# Altium footprint library PowerProducts.PCBLIB: 166 footprints (part 4 of 11)
Each footprint in its own frame and in the unit in brackets; x right, y up, seen from the top. Pads: shape width x height; smd on the part's side, far side on the other; paste and mask are expansions set on the pad; w line width, h text height; cw(c..) or ccw(c..) is an arc to the next point about the centre after c.
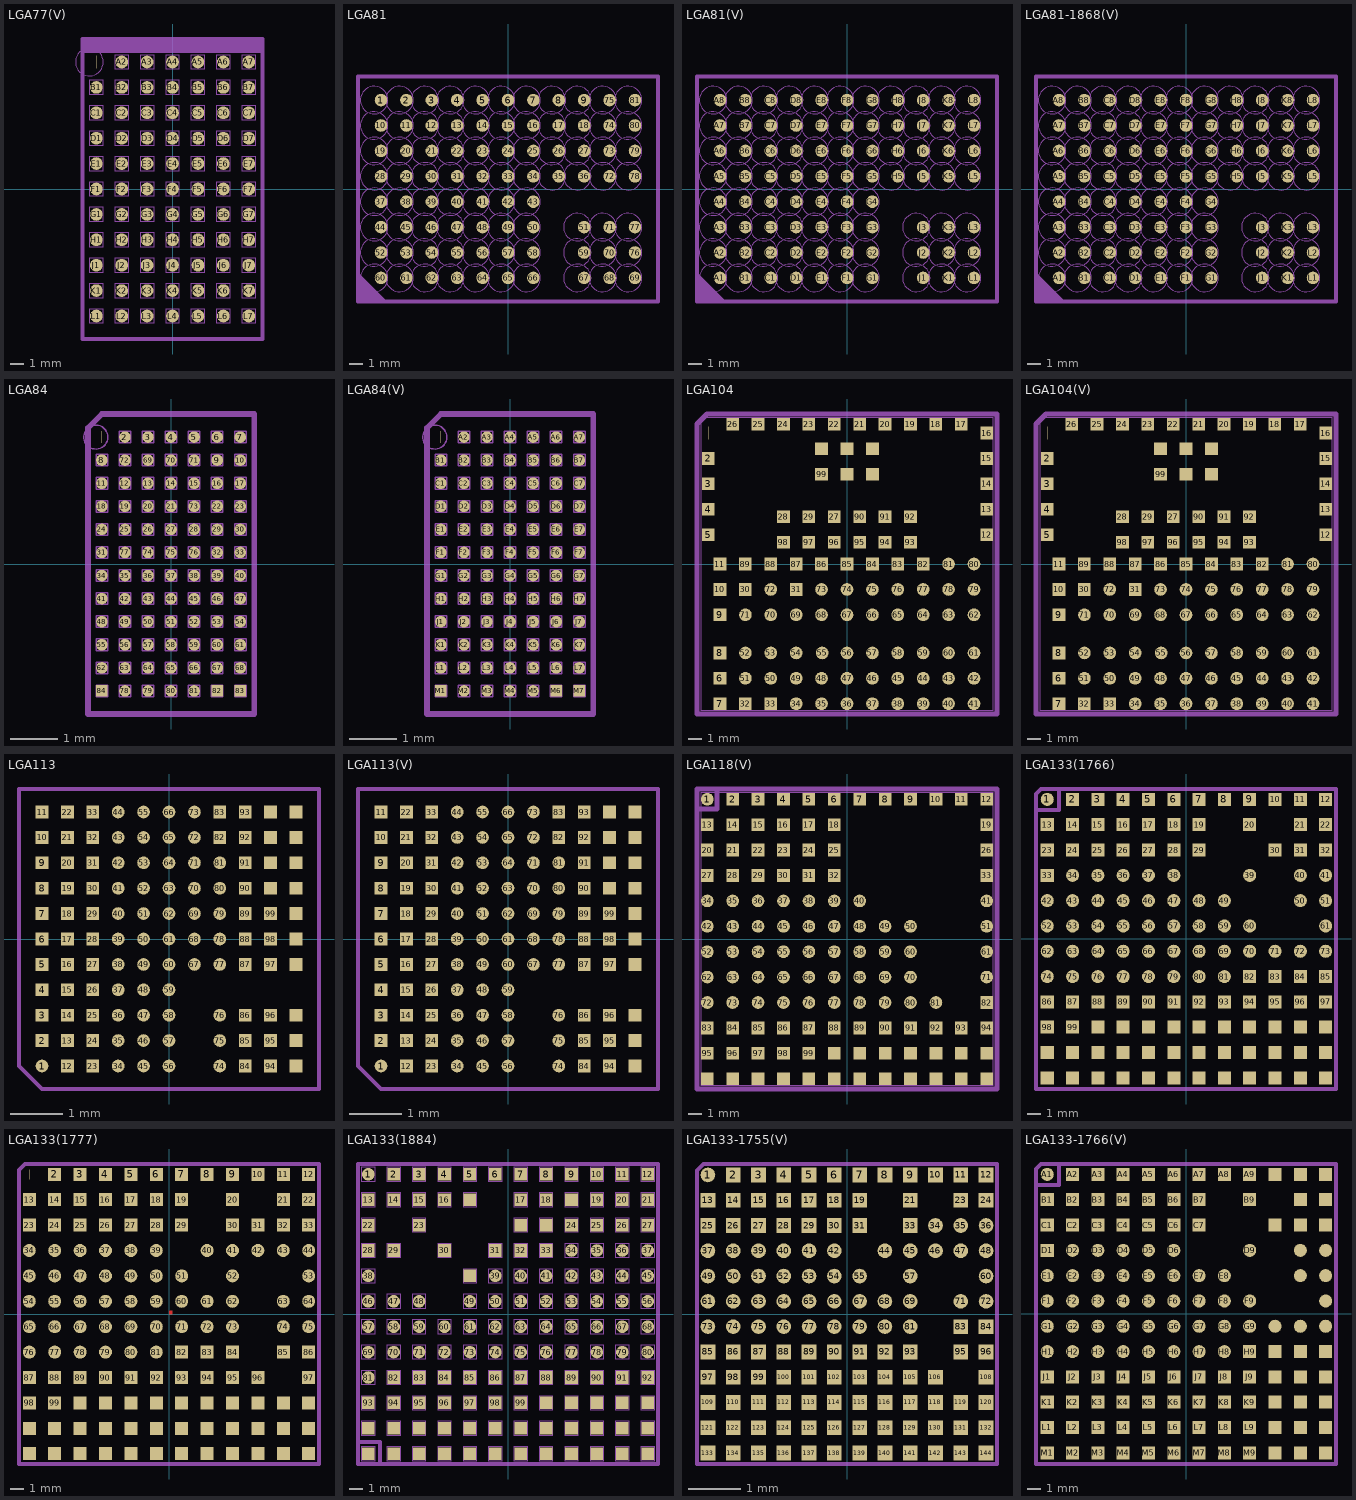
[diagram p3: the footprints below, top view; thin cyan lines are the x and y axes]

## LGA77(V) [mil]
pads (77):
  rrect100% 0x37.5 smd: A1(-225,375)
  rrect100% 37.5x37.5 smd: A2(-150,375) A3(-75,375) A4(0,375) A5(75,375) A6(150,375) A7(225,375) B1(-225,300) B2(-150,300) B3(-75,300) B4(0,300) B5(75,300) B6(150,300) B7(225,300) C1(-225,225) C2(-150,225) C3(-75,225) C4(0,225) C5(75,225) C6(150,225) C7(225,225) D1(-225,150) D2(-150,150) D3(-75,150) D4(0,150) D5(75,150) D6(150,150) D7(225,150) E1(-225,75) E2(-150,75) E3(-75,75) E4(0,75) E5(75,75) E6(150,75) E7(225,75) F1(-225,0) F2(-150,0) F3(-75,0) F4(0,0) F5(75,0) F6(150,0) F7(225,0) G1(-225,-75) G2(-150,-75) G3(-75,-75) G4(0,-75) G5(75,-75) G6(150,-75) G7(225,-75) H1(-225,-150) H2(-150,-150) H3(-75,-150) H4(0,-150) H5(75,-150) H6(150,-150) H7(225,-150) J1(-225,-225) J2(-150,-225) J3(-75,-225) J4(0,-225) J5(75,-225) J6(150,-225) J7(225,-225) K1(-225,-300) K2(-150,-300) K3(-75,-300) K4(0,-300) K5(75,-300) K6(150,-300) K7(225,-300) L1(-225,-375) L2(-150,-375) L3(-75,-375) L4(0,-375) L5(75,-375) L6(150,-375) L7(225,-375)
Mechanical 2:
  drawing of 314 lines, arcs and shapes, not listed

## LGA81 [mil]
pads (81):
  rrect100% 37.2x37.2 smd: 1(-375,262.5) 2(-300,262.5) 3(-225,262.5) 4(-150,262.5) 5(-75,262.5) 6(0,262.5) 7(75,262.5) 8(150,262.5) 9(225,262.5) 10(-375,187.5) 11(-300,187.5) 12(-225,187.5) 13(-150,187.5) 14(-75,187.5) 15(0,187.5) 16(75,187.5) 17(150,187.5) 18(225,187.5) 19(-375,112.5) 20(-300,112.5) 21(-225,112.5) 22(-150,112.5) 23(-75,112.5) 24(0,112.5) 25(75,112.5) 26(150,112.5) 27(225,112.5) 28(-375,37.5) 29(-300,37.5) 30(-225,37.5) 31(-150,37.5) 32(-75,37.5) 33(0,37.5) 34(75,37.5) 35(150,37.5) 36(225,37.5) 37(-375,-37.5) 38(-300,-37.5) 39(-225,-37.5) 40(-150,-37.5) 41(-75,-37.5) 42(0,-37.5) 43(75,-37.5) 44(-375,-112.5) 45(-300,-112.5) 46(-225,-112.5) 47(-150,-112.5) 48(-75,-112.5) 49(0,-112.5) 50(75,-112.5) 51(225,-112.5) 52(-375,-187.5) 53(-300,-187.5) 54(-225,-187.5) 55(-150,-187.5) 56(-75,-187.5) 57(0,-187.5) 58(75,-187.5) 59(225,-187.5) 60(-375,-262.5) 61(-300,-262.5) 62(-225,-262.5) 63(-150,-262.5) 64(-75,-262.5) 65(0,-262.5) 66(75,-262.5) 67(225,-262.5) 68(300,-262.5) 69(375,-262.5) 70(300,-187.5) 71(300,-112.5) 72(300,37.5) 73(300,112.5) 74(300,187.5) 75(300,262.5) 76(375,-187.5) 77(375,-112.5) 78(375,37.5) 79(375,112.5) 80(375,187.5) 81(375,262.5)
Mechanical 2:
  drawing of 172 lines, arcs and shapes, not listed

## LGA81(V) [mil]
pads (81):
  rrect100% 37.2x37.2 smd: A1(-375,-262.5) A2(-375,-187.5) A3(-375,-112.5) A4(-375,-37.5) A5(-375,37.5) A6(-375,112.5) A7(-375,187.5) A8(-375,262.5) B1(-300,-262.5) B2(-300,-187.5) B3(-300,-112.5) B4(-300,-37.5) B5(-300,37.5) B6(-300,112.5) B7(-300,187.5) B8(-300,262.5) C1(-225,-262.5) C2(-225,-187.5) C3(-225,-112.5) C4(-225,-37.5) C5(-225,37.5) C6(-225,112.5) C7(-225,187.5) C8(-225,262.5) D1(-150,-262.5) D2(-150,-187.5) D3(-150,-112.5) D4(-150,-37.5) D5(-150,37.5) D6(-150,112.5) D7(-150,187.5) D8(-150,262.5) E1(-75,-262.5) E2(-75,-187.5) E3(-75,-112.5) E4(-75,-37.5) E5(-75,37.5) E6(-75,112.5) E7(-75,187.5) E8(-75,262.5) F1(0,-262.5) F2(0,-187.5) F3(0,-112.5) F4(0,-37.5) F5(0,37.5) F6(0,112.5) F7(0,187.5) F8(0,262.5) G1(75,-262.5) G2(75,-187.5) G3(75,-112.5) G4(75,-37.5) G5(75,37.5) G6(75,112.5) G7(75,187.5) G8(75,262.5) H5(150,37.5) H6(150,112.5) H7(150,187.5) H8(150,262.5) J1(225,-262.5) J2(225,-187.5) J3(225,-112.5) J5(225,37.5) J6(225,112.5) J7(225,187.5) J8(225,262.5) K1(300,-262.5) K2(300,-187.5) K3(300,-112.5) K5(300,37.5) K6(300,112.5) K7(300,187.5) K8(300,262.5) L1(375,-262.5) L2(375,-187.5) L3(375,-112.5) L5(375,37.5) L6(375,112.5) L7(375,187.5) L8(375,262.5)
Mechanical 2:
  drawing of 172 lines, arcs and shapes, not listed

## LGA81-1868(V) [mil]
pads (81):
  rrect100% 37.2x37.2 smd: A1(-375,-262.5) A2(-375,-187.5) A3(-375,-112.5) A4(-375,-37.5) A5(-375,37.5) A6(-375,112.5) A7(-375,187.5) A8(-375,262.5) B1(-300,-262.5) B2(-300,-187.5) B3(-300,-112.5) B4(-300,-37.5) B5(-300,37.5) B6(-300,112.5) B7(-300,187.5) B8(-300,262.5) C1(-225,-262.5) C2(-225,-187.5) C3(-225,-112.5) C4(-225,-37.5) C5(-225,37.5) C6(-225,112.5) C7(-225,187.5) C8(-225,262.5) D1(-150,-262.5) D2(-150,-187.5) D3(-150,-112.5) D4(-150,-37.5) D5(-150,37.5) D6(-150,112.5) D7(-150,187.5) D8(-150,262.5) E1(-75,-262.5) E2(-75,-187.5) E3(-75,-112.5) E4(-75,-37.5) E5(-75,37.5) E6(-75,112.5) E7(-75,187.5) E8(-75,262.5) F1(0,-262.5) F2(0,-187.5) F3(0,-112.5) F4(0,-37.5) F5(0,37.5) F6(0,112.5) F7(0,187.5) F8(0,262.5) G1(75,-262.5) G2(75,-187.5) G3(75,-112.5) G4(75,-37.5) G5(75,37.5) G6(75,112.5) G7(75,187.5) G8(75,262.5) H5(150,37.5) H6(150,112.5) H7(150,187.5) H8(150,262.5) J1(225,-262.5) J2(225,-187.5) J3(225,-112.5) J5(225,37.5) J6(225,112.5) J7(225,187.5) J8(225,262.5) K1(300,-262.5) K2(300,-187.5) K3(300,-112.5) K5(300,37.5) K6(300,112.5) K7(300,187.5) K8(300,262.5) L1(375,-262.5) L2(375,-187.5) L3(375,-112.5) L5(375,37.5) L6(375,112.5) L7(375,187.5) L8(375,262.5)
Mechanical 2:
  drawing of 172 lines, arcs and shapes, not listed

## LGA84 [mil]
pads (84):
  rrect100% 0x9.91 smd: 1(-57.15,104.78)
  rrect100% 9.53x9.53 smd: 2(-38.1,104.78) 3(-19.05,104.78) 4(0,104.78) 5(19.05,104.78) 6(38.1,104.78) 7(57.15,104.78) 8(-57.15,85.73) 9(38.1,85.73) 10(57.15,85.73) 11(-57.15,66.68) 12(-38.1,66.68) 13(-19.05,66.68) 14(0,66.68) 15(19.05,66.68) 16(38.1,66.68) 17(57.15,66.68) 18(-57.15,47.63) 19(-38.1,47.63) 20(-19.05,47.63) 21(0,47.63) 22(38.1,47.63) 23(57.15,47.63) 24(-57.15,28.58) 25(-38.1,28.58) 26(-19.05,28.58) 27(0,28.58) 28(19.05,28.58) 29(38.1,28.58) 30(57.15,28.58) 31(-57.15,9.53) 32(38.1,9.53) 33(57.15,9.53) 34(-57.15,-9.53) 35(-38.1,-9.53) 36(-19.05,-9.53) 37(0,-9.53) 38(19.05,-9.53) 39(38.1,-9.53) 40(57.15,-9.53) 41(-57.15,-28.58) 42(-38.1,-28.58) 43(-19.05,-28.58) 44(0,-28.58) 45(19.05,-28.58) 46(38.1,-28.58) 47(57.15,-28.58) 48(-57.15,-47.63) 49(-38.1,-47.63) 50(-19.05,-47.63) 51(0,-47.63) 52(19.05,-47.63) 53(38.1,-47.63) 54(57.15,-47.63) 55(-57.15,-66.68) 56(-38.1,-66.68) 57(-19.05,-66.68) 58(0,-66.68) 59(19.05,-66.68) 60(38.1,-66.68) 61(57.15,-66.68) 62(-57.15,-85.73) 63(-38.1,-85.73) 64(-19.05,-85.73) 65(0,-85.73) 66(19.05,-85.73) 67(38.1,-85.73) 68(57.15,-85.73) 69(-19.05,85.73) 70(0,85.73) 71(19.05,85.73) 72(-38.1,85.73) 73(19.05,47.63) 74(-19.05,9.53) 75(0,9.53) 76(19.05,9.53) 77(-38.1,9.53) 78(-38.1,-104.78) 79(-19.05,-104.78) 80(0,-104.78) 81(19.05,-104.78)
  rect 9.53x9.53 smd: 82(38.1,-104.78) 83(57.15,-104.78) 84(-57.15,-104.78)
Mechanical 2:
  drawing of 671 lines, arcs and shapes, not listed

## LGA84(V) [mil]
pads (84):
  rrect100% 0x9.91 smd: A1(-57.15,104.78)
  rrect100% 9.53x9.53 smd: A2(-38.1,104.78) A3(-19.05,104.78) A4(0,104.78) A5(19.05,104.78) A6(38.1,104.78) A7(57.15,104.78) B1(-57.15,85.73) B2(-38.1,85.73) B3(-19.05,85.73) B4(0,85.73) B5(19.05,85.73) B6(38.1,85.73) B7(57.15,85.73) C1(-57.15,66.68) C2(-38.1,66.68) C3(-19.05,66.68) C4(0,66.68) C5(19.05,66.68) C6(38.1,66.68) C7(57.15,66.68) D1(-57.15,47.63) D2(-38.1,47.63) D3(-19.05,47.63) D4(0,47.63) D5(19.05,47.63) D6(38.1,47.63) D7(57.15,47.63) E1(-57.15,28.58) E2(-38.1,28.58) E3(-19.05,28.58) E4(0,28.58) E5(19.05,28.58) E6(38.1,28.58) E7(57.15,28.58) F1(-57.15,9.53) F2(-38.1,9.53) F3(-19.05,9.53) F4(0,9.53) F5(19.05,9.53) F6(38.1,9.53) F7(57.15,9.53) G1(-57.15,-9.53) G2(-38.1,-9.53) G3(-19.05,-9.53) G4(0,-9.53) G5(19.05,-9.53) G6(38.1,-9.53) G7(57.15,-9.53) H1(-57.15,-28.58) H2(-38.1,-28.58) H3(-19.05,-28.58) H4(0,-28.58) H5(19.05,-28.58) H6(38.1,-28.58) H7(57.15,-28.58) J1(-57.15,-47.63) J2(-38.1,-47.63) J3(-19.05,-47.63) J4(0,-47.63) J5(19.05,-47.63) J6(38.1,-47.63) J7(57.15,-47.63) K1(-57.15,-66.68) K2(-38.1,-66.68) K3(-19.05,-66.68) K4(0,-66.68) K5(19.05,-66.68) K6(38.1,-66.68) K7(57.15,-66.68) L1(-57.15,-85.73) L2(-38.1,-85.73) L3(-19.05,-85.73) L4(0,-85.73) L5(19.05,-85.73) L6(38.1,-85.73) L7(57.15,-85.73) M2(-38.1,-104.78) M3(-19.05,-104.78) M4(0,-104.78) M5(19.05,-104.78)
  rect 9.53x9.53 smd: M1(-57.15,-104.78) M6(38.1,-104.78) M7(57.15,-104.78)
Mechanical 2:
  drawing of 339 lines, arcs and shapes, not listed

## LGA104 [mil]
pads (104):
  rrect100% 0x37.5 smd: 1(-409.97,386.66)
  rect 37.5x37.5 smd: 2(-409.97,311.66) 3(-409.97,236.66) 4(-409.97,161.66) 5(-409.97,86.66) 6(-375,-337.5) 7(-375,-412.5) 8(-375,-262.5) 9(-375,-150) 10(-375,-75) 11(-375,0) 12(412.59,86.66) 13(412.59,161.66) 14(412.59,236.66) 15(412.59,311.66) 16(412.59,386.66) 17(337.45,412.72) 18(262.45,412.72) 19(187.45,412.72) 20(112.45,412.72) 21(37.45,412.72) 22(-37.55,412.72) 23(-112.55,412.72) 24(-187.55,412.72) 25(-262.55,412.72) 26(-337.55,412.72) 27(-37.55,139.37) 28(-187.55,139.37) 29(-112.55,139.37) 30(-300,-75) 31(-150,-75) 32(-300,-412.5) 33(-225,-412.5) 82(225,0) 83(150,0) 84(75,0) 85(0,0) 86(-75,0) 87(-150,0) 88(-225,0) 89(-300,0) 90(37.45,139.37) 91(112.45,139.37) 92(187.45,139.37) 93(187.45,64.37) 94(112.45,64.37) 95(37.45,64.37) 96(-37.55,64.37) 97(-112.55,64.37) 98(-187.55,64.37) 99(-75,265.45) 100(0,265.45) 101(75,265.45) 102(75,340.45) 103(0,340.45) 104(-75,340.45)
  rrect100% 37.5x37.5 smd: 34(-150,-412.5) 35(-75,-412.5) 36(0,-412.5) 37(75,-412.5) 38(150,-412.5) 39(225,-412.5) 40(300,-412.5) 41(375,-412.5) 42(375,-337.5) 43(300,-337.5) 44(225,-337.5) 45(150,-337.5) 46(75,-337.5) 47(0,-337.5) 48(-75,-337.5) 49(-150,-337.5) 50(-225,-337.5) 51(-300,-337.5) 52(-300,-262.5) 53(-225,-262.5) 54(-150,-262.5) 55(-73.23,-262.5) 56(0,-262.5) 57(75,-262.5) 58(150,-262.5) 59(225,-262.5) 60(300,-262.5) 61(375,-262.5) 62(375,-150) 63(300,-150) 64(225,-150) 65(150,-150) 66(75,-150) 67(0,-150) 68(-75,-150) 69(-150,-150) 70(-225,-150) 71(-300,-150) 72(-225,-75) 73(-75,-75) 74(0,-75) 75(75,-75) 76(150,-75) 77(225,-75) 78(300,-75) 79(375,-75) 80(375,0) 81(300,0)
Top Layer:
  region: 0,0 10,0 10,10 0,10
Top Paste:
  region: 0,0 10,0 10,10 0,10
Top Solder:
  region: 0,0 10,0 10,10 0,10
Mechanical 2:
  lines w0.3: -431.69,-431.69 431.69,-431.69 431.69,431.69 -431.69,431.69 -431.69,-431.69
  lines w15: -442.91,-442.91 -442.91,413.39 -413.39,442.91 442.91,442.91 442.91,-442.91 -442.91,-442.91

## LGA104(V) [mil]
pads (104):
  rrect100% 0x37.5 smd: 1(-409.97,386.66)
  rect 37.5x37.5 smd: 2(-409.97,311.66) 3(-409.97,236.66) 4(-409.97,161.66) 5(-409.97,86.66) 6(-375,-337.5) 7(-375,-412.5) 8(-375,-262.5) 9(-375,-150) 10(-375,-75) 11(-375,0) 12(412.59,86.66) 13(412.59,161.66) 14(412.59,236.66) 15(412.59,311.66) 16(412.59,386.66) 17(337.45,412.72) 18(262.45,412.72) 19(187.45,412.72) 20(112.45,412.72) 21(37.45,412.72) 22(-37.55,412.72) 23(-112.55,412.72) 24(-187.55,412.72) 25(-262.55,412.72) 26(-337.55,412.72) 27(-37.55,139.37) 28(-187.55,139.37) 29(-112.55,139.37) 30(-300,-75) 31(-150,-75) 32(-300,-412.5) 33(-225,-412.5) 82(225,0) 83(150,0) 84(75,0) 85(0,0) 86(-75,0) 87(-150,0) 88(-225,0) 89(-300,0) 90(37.45,139.37) 91(112.45,139.37) 92(187.45,139.37) 93(187.45,64.37) 94(112.45,64.37) 95(37.45,64.37) 96(-37.55,64.37) 97(-112.55,64.37) 98(-187.55,64.37) 99(-75,265.45) 100(0,265.45) 101(75,265.45) 102(75,340.45) 103(0,340.45) 104(-75,340.45)
  rrect100% 37.5x37.5 smd: 34(-150,-412.5) 35(-75,-412.5) 36(0,-412.5) 37(75,-412.5) 38(150,-412.5) 39(225,-412.5) 40(300,-412.5) 41(375,-412.5) 42(375,-337.5) 43(300,-337.5) 44(225,-337.5) 45(150,-337.5) 46(75,-337.5) 47(0,-337.5) 48(-75,-337.5) 49(-150,-337.5) 50(-225,-337.5) 51(-300,-337.5) 52(-300,-262.5) 53(-225,-262.5) 54(-150,-262.5) 55(-73.23,-262.5) 56(0,-262.5) 57(75,-262.5) 58(150,-262.5) 59(225,-262.5) 60(300,-262.5) 61(375,-262.5) 62(375,-150) 63(300,-150) 64(225,-150) 65(150,-150) 66(75,-150) 67(0,-150) 68(-75,-150) 69(-150,-150) 70(-225,-150) 71(-300,-150) 72(-225,-75) 73(-75,-75) 74(0,-75) 75(75,-75) 76(150,-75) 77(225,-75) 78(300,-75) 79(375,-75) 80(375,0) 81(300,0)
Top Layer:
  region: 0,0 10,0 10,10 0,10
Top Paste:
  region: 0,0 10,0 10,10 0,10
Top Solder:
  region: 0,0 10,0 10,10 0,10
Mechanical 2:
  lines w0.3: -431.69,-431.69 431.69,-431.69 431.69,431.69 -431.69,431.69 -431.69,-431.69
  lines w15: -442.91,-442.91 -442.91,413.39 -413.39,442.91 442.91,442.91 442.91,-442.91 -442.91,-442.91

## LGA113 [mil]
pads (113):
  rrect100% 9.53x9.53 smd: 1(-95.25,-95.25) 34(-38.1,-95.25) 35(-38.1,-76.2) 36(-38.1,-57.15) 37(-38.1,-38.1) 38(-38.1,-19.05) 39(-38.1,0) 40(-38.1,19.05) 41(-38.1,38.1) 42(-38.1,57.15) 43(-38.1,76.2) 44(-38.1,95.25) 45(-19.05,-95.25) 46(-19.05,-76.2) 47(-19.05,-57.15) 48(-19.05,-38.1) 49(-19.05,-19.05) 50(-19.05,0) 51(-19.05,19.05) 52(-19.05,38.1) 53(-19.05,57.15) 54(-19.05,76.2) 55(-19.05,95.25) 56(0,-95.25) 57(0,-76.2) 58(0,-57.15) 59(0,-38.1) 60(0,-19.05) 61(0,0) 62(0,19.05) 63(0,38.1) 64(0,57.15) 65(0,76.2) 66(0,95.25) 67(19.05,-19.05) 68(19.05,0) 69(19.05,19.05) 70(19.05,38.1) 71(19.05,57.15) 72(19.05,76.2) 73(19.05,95.25) 74(38.1,-95.25) 75(38.1,-76.2) 76(38.1,-57.15) 77(38.1,-19.05) 78(38.1,0) 79(38.1,19.05) 80(38.1,38.1) 81(38.1,57.15)
  rect 9.53x9.53 smd: 2(-95.25,-76.2) 3(-95.25,-57.15) 4(-95.25,-38.1) 5(-95.25,-19.05) 6(-95.25,0) 7(-95.25,19.05) 8(-95.25,38.1) 9(-95.25,57.15) 10(-95.25,76.2) 11(-95.25,95.25) 12(-76.2,-95.25) 13(-76.2,-76.2) 14(-76.2,-57.15) 15(-76.2,-38.1) 16(-76.2,-19.05) 17(-76.2,0) 18(-76.2,19.05) 19(-76.2,38.1) 20(-76.2,57.15) 21(-76.2,76.2) 22(-76.2,95.25) 23(-57.15,-95.25) 24(-57.15,-76.2) 25(-57.15,-57.15) 26(-57.15,-38.1) 27(-57.15,-19.05) 28(-57.15,0) 29(-57.15,19.05) 30(-57.15,38.1) 31(-57.15,57.15) 32(-57.15,76.2) 33(-57.15,95.25) 82(38.1,76.2) 83(38.1,95.25) 84(57.15,-95.25) 85(57.15,-76.2) 86(57.15,-57.15) 87(57.15,-19.05) 88(57.15,0) 89(57.15,19.05) 90(57.15,38.1) 91(57.15,57.15) 92(57.15,76.2) 93(57.15,95.25) 94(76.2,-95.25) 95(76.2,-76.2) 96(76.2,-57.15) 97(76.2,-19.05) 98(76.2,0) 99(76.2,19.05) 100(76.2,38.1) 101(76.2,57.15) 102(76.2,76.2) 103(76.2,95.25) 104(95.25,-95.25) 105(95.25,-76.2) 106(95.25,-57.15) 107(95.25,-19.05) 108(95.25,0) 109(95.25,19.05) 110(95.25,38.1) 111(95.25,57.15) 112(95.25,76.2) 113(95.25,95.25)
Mechanical 2:
  lines w3.05: -112.5,-95.35 -95.35,-112.5 112.5,-112.5 112.5,112.5 -112.5,112.5 -112.5,-95.35

## LGA113(V) [mil]
pads (113):
  rrect100% 9.53x9.53 smd: 1(-95.25,-95.25) 34(-38.1,-95.25) 35(-38.1,-76.2) 36(-38.1,-57.15) 37(-38.1,-38.1) 38(-38.1,-19.05) 39(-38.1,0) 40(-38.1,19.05) 41(-38.1,38.1) 42(-38.1,57.15) 43(-38.1,76.2) 44(-38.1,95.25) 45(-19.05,-95.25) 46(-19.05,-76.2) 47(-19.05,-57.15) 48(-19.05,-38.1) 49(-19.05,-19.05) 50(-19.05,0) 51(-19.05,19.05) 52(-19.05,38.1) 53(-19.05,57.15) 54(-19.05,76.2) 55(-19.05,95.25) 56(0,-95.25) 57(0,-76.2) 58(0,-57.15) 59(0,-38.1) 60(0,-19.05) 61(0,0) 62(0,19.05) 63(0,38.1) 64(0,57.15) 65(0,76.2) 66(0,95.25) 67(19.05,-19.05) 68(19.05,0) 69(19.05,19.05) 70(19.05,38.1) 71(19.05,57.15) 72(19.05,76.2) 73(19.05,95.25) 74(38.1,-95.25) 75(38.1,-76.2) 76(38.1,-57.15) 77(38.1,-19.05) 78(38.1,0) 79(38.1,19.05) 80(38.1,38.1) 81(38.1,57.15)
  rect 9.53x9.53 smd: 2(-95.25,-76.2) 3(-95.25,-57.15) 4(-95.25,-38.1) 5(-95.25,-19.05) 6(-95.25,0) 7(-95.25,19.05) 8(-95.25,38.1) 9(-95.25,57.15) 10(-95.25,76.2) 11(-95.25,95.25) 12(-76.2,-95.25) 13(-76.2,-76.2) 14(-76.2,-57.15) 15(-76.2,-38.1) 16(-76.2,-19.05) 17(-76.2,0) 18(-76.2,19.05) 19(-76.2,38.1) 20(-76.2,57.15) 21(-76.2,76.2) 22(-76.2,95.25) 23(-57.15,-95.25) 24(-57.15,-76.2) 25(-57.15,-57.15) 26(-57.15,-38.1) 27(-57.15,-19.05) 28(-57.15,0) 29(-57.15,19.05) 30(-57.15,38.1) 31(-57.15,57.15) 32(-57.15,76.2) 33(-57.15,95.25) 82(38.1,76.2) 83(38.1,95.25) 84(57.15,-95.25) 85(57.15,-76.2) 86(57.15,-57.15) 87(57.15,-19.05) 88(57.15,0) 89(57.15,19.05) 90(57.15,38.1) 91(57.15,57.15) 92(57.15,76.2) 93(57.15,95.25) 94(76.2,-95.25) 95(76.2,-76.2) 96(76.2,-57.15) 97(76.2,-19.05) 98(76.2,0) 99(76.2,19.05) 100(76.2,38.1) 101(76.2,57.15) 102(76.2,76.2) 103(76.2,95.25) 104(95.25,-95.25) 105(95.25,-76.2) 106(95.25,-57.15) 107(95.25,-19.05) 108(95.25,0) 109(95.25,19.05) 110(95.25,38.1) 111(95.25,57.15) 112(95.25,76.2) 113(95.25,95.25)
Mechanical 2:
  lines w3.05: -112.5,-95.35 -95.35,-112.5 112.5,-112.5 112.5,112.5 -112.5,112.5 -112.5,-95.35

## LGA118(V) [mil]
pads (118):
  rrect100% 37.5x37.5 smd: 1(-412.5,412.5) 34(-412.5,112.5) 35(-337.5,112.5) 36(-262.5,112.5) 37(-187.5,112.5) 38(-112.5,112.5) 39(-37.5,112.5) 40(37.5,112.5) 41(412.5,112.5) 42(-412.5,37.5) 43(-337.5,37.5) 44(-262.5,37.5) 45(-187.5,37.5) 46(-112.5,37.5) 47(-37.5,37.5) 48(37.5,37.5) 49(112.5,37.5) 50(187.5,37.5) 51(412.5,37.5) 52(-412.5,-37.5) 53(-337.5,-37.5) 54(-262.5,-37.5) 55(-187.5,-37.5) 56(-112.5,-37.5) 57(-37.5,-37.5) 58(37.5,-37.5) 59(112.5,-37.5) 60(187.5,-37.5) 61(412.5,-37.5) 62(-412.5,-112.5) 63(-337.5,-112.5) 64(-262.5,-112.5) 65(-187.5,-112.5) 66(-112.5,-112.5) 67(-37.5,-112.5) 68(37.5,-112.5) 69(112.5,-112.5) 70(187.5,-112.5) 71(412.5,-112.5) 72(-412.5,-187.5) 73(-337.5,-187.5) 74(-262.5,-187.5) 75(-187.5,-187.5) 76(-112.5,-187.5) 77(-37.5,-187.5) 78(37.5,-187.5) 79(112.5,-187.5) 80(187.5,-187.5) 81(262.5,-187.5)
  rect 37.5x37.5 smd: 2(-337.5,412.5) 3(-262.5,412.5) 4(-187.5,412.5) 5(-112.5,412.5) 6(-37.5,412.5) 7(37.5,412.5) 8(112.5,412.5) 9(187.5,412.5) 10(262.5,412.5) 11(337.5,412.5) 12(412.5,412.5) 13(-412.5,337.5) 14(-337.5,337.5) 15(-262.5,337.5) 16(-187.5,337.5) 17(-112.5,337.5) 18(-37.5,337.5) 19(412.5,337.5) 20(-412.5,262.5) 21(-337.5,262.5) 22(-262.5,262.5) 23(-187.5,262.5) 24(-112.5,262.5) 25(-37.5,262.5) 26(412.5,262.5) 27(-412.5,187.5) 28(-337.5,187.5) 29(-262.5,187.5) 30(-187.5,187.5) 31(-112.5,187.5) 32(-37.5,187.5) 33(412.5,187.5) 82(412.5,-187.5) 83(-412.5,-262.5) 84(-337.5,-262.5) 85(-262.5,-262.5) 86(-187.5,-262.5) 87(-112.5,-262.5) 88(-37.5,-262.5) 89(37.5,-262.5) 90(112.5,-262.5) 91(187.5,-262.5) 92(262.5,-262.5) 93(337.5,-262.5) 94(412.5,-262.5) 95(-412.5,-337.5) 96(-337.5,-337.5) 97(-262.5,-337.5) 98(-187.5,-337.5) 99(-112.5,-337.5) 100(-37.5,-337.5) 101(37.5,-337.5) 102(112.5,-337.5) 103(187.5,-337.5) 104(262.5,-337.5) 105(337.5,-337.5) 106(412.5,-337.5) 107(-412.5,-412.5) 108(-337.5,-412.5) 109(-262.5,-412.5) 110(-187.5,-412.5) 111(-112.5,-412.5) 112(-37.5,-412.5) 113(37.5,-412.5) 114(112.5,-412.5) 115(187.5,-412.5) 116(262.5,-412.5) 117(337.5,-412.5) 118(412.5,-412.5)
Mechanical 2:
  lines w0.3: -431.69,-431.69 431.69,-431.69 431.69,431.69 -431.69,431.69 -431.69,-431.69
  lines w15: -442.5,383.86 -383.86,383.86 -383.86,442.5 ; -442.91,-442.91 -442.91,442.09 -442.09,442.91 442.91,442.91 442.91,-442.91 -442.91,-442.91

## LGA133(1766) [mil]
pads (133):
  rrect100% 38.68x38.68 smd: 1(-412.5,412.5) 34(-337.5,187.5) 35(-262.5,187.5) 36(-187.5,187.5) 37(-112.5,187.5) 38(-37.5,187.5) 39(187.5,187.5) 40(337.5,187.5) 41(412.5,187.5) 42(-412.5,112.5) 43(-337.5,112.5) 44(-262.5,112.5) 45(-187.5,112.5) 46(-112.5,112.5) 47(-37.5,112.5) 48(37.5,112.5) 49(112.5,112.5) 50(337.5,112.5) 51(412.5,112.5) 52(-412.5,37.5) 53(-337.5,37.5) 54(-262.5,37.5) 55(-187.5,37.5) 56(-112.5,37.5) 57(-37.5,37.5) 58(37.5,37.5) 59(112.5,37.5) 60(187.5,37.5) 61(412.5,37.5) 62(-412.5,-37.5) 63(-337.5,-37.5) 64(-262.5,-37.5) 65(-187.5,-37.5) 66(-112.5,-37.5) 67(-37.5,-37.5) 68(37.5,-37.5) 69(112.5,-37.5) 70(187.5,-37.5) 71(262.5,-37.5) 72(337.5,-37.5) 73(412.5,-37.5) 74(-412.5,-112.5) 75(-337.5,-112.5) 76(-262.5,-112.5) 77(-187.5,-112.5) 78(-112.5,-112.5) 79(-37.5,-112.5) 80(37.5,-112.5) 81(112.5,-112.5)
  rect 38.68x38.68 smd: 2(-337.5,412.5) 3(-262.5,412.5) 4(-187.5,412.5) 5(-112.5,412.5) 6(-37.5,412.5) 7(37.5,412.5) 8(112.5,412.5) 9(187.5,412.5) 10(262.5,412.5) 11(337.5,412.5) 12(412.5,412.5) 13(-412.5,337.5) 14(-337.5,337.5) 15(-262.5,337.5) 16(-187.5,337.5) 17(-112.5,337.5) 18(-37.5,337.5) 19(37.5,337.5) 20(187.5,337.5) 21(337.5,337.5) 22(412.5,337.5) 23(-412.5,262.5) 24(-337.5,262.5) 25(-262.5,262.5) 26(-187.5,262.5) 27(-112.5,262.5) 28(-37.5,262.5) 29(37.5,262.5) 30(262.5,262.5) 31(337.5,262.5) 32(412.5,262.5) 33(-412.5,187.5) 82(187.5,-112.5) 83(262.5,-112.5) 84(337.5,-112.5) 85(412.5,-112.5) 86(-412.5,-187.5) 87(-337.5,-187.5) 88(-262.5,-187.5) 89(-187.5,-187.5) 90(-112.5,-187.5) 91(-37.5,-187.5) 92(37.5,-187.5) 93(112.5,-187.5) 94(187.5,-187.5) 95(262.5,-187.5) 96(337.5,-187.5) 97(412.5,-187.5) 98(-412.5,-262.5) 99(-337.5,-262.5) 100(-262.5,-262.5) 101(-187.5,-262.5) 102(-112.5,-262.5) 103(-37.5,-262.5) 104(37.5,-262.5) 105(112.5,-262.5) 106(187.5,-262.5) 107(262.5,-262.5) 108(337.5,-262.5) 109(412.5,-262.5) 110(-412.5,-337.5) 111(-337.5,-337.5) 112(-262.5,-337.5) 113(-187.5,-337.5) 114(-112.5,-337.5) 115(-37.5,-337.5) 116(37.5,-337.5) 117(112.5,-337.5) 118(187.5,-337.5) 119(262.5,-337.5) 120(337.5,-337.5) 121(412.5,-337.5) 122(-412.5,-412.5) 123(-337.5,-412.5) 124(-262.5,-412.5) 125(-187.5,-412.5) 126(-112.5,-412.5) 127(-37.5,-412.5) 128(37.5,-412.5) 129(112.5,-412.5) 130(187.5,-412.5) 131(262.5,-412.5) 132(337.5,-412.5) 133(412.5,-412.5)
Mechanical 2:
  lines w11.81: -445.87,380.91 -377.95,380.91 -377.95,442.91 ; -445.57,-445.57 -445.57,428.44 -430.81,443.21 443.21,443.21 443.21,-445.57 -445.57,-445.57

## LGA133(1777) [mil]
pads (133):
  rrect100% 0x29.53 smd: 1(-412.5,412.5)
  rect 38.39x38.39 smd: 2(-337.5,412.5) 3(-262.5,412.5) 4(-187.5,412.5) 5(-112.5,412.5) 6(-37.5,412.5) 7(37.5,412.5) 8(112.5,412.5) 9(187.5,412.5) 10(262.5,412.5) 11(337.5,412.5) 12(412.5,412.5) 13(-412.5,337.5) 14(-337.5,337.5) 15(-262.5,337.5) 16(-187.5,337.5) 17(-112.5,337.5) 18(-37.5,337.5) 19(37.5,337.5) 20(187.5,337.5) 21(337.5,337.5) 22(412.5,337.5) 23(-412.5,262.5) 24(-337.5,262.5) 25(-262.5,262.5) 26(-187.5,262.5) 27(-112.5,262.5) 28(-37.5,262.5) 29(37.5,262.5) 30(187.5,262.5) 31(262.5,262.5) 32(337.5,262.5) 33(412.5,262.5) 82(37.5,-112.5) 83(112.5,-112.5) 84(187.5,-112.5) 85(337.5,-112.5) 86(412.5,-112.5) 87(-412.5,-187.5) 88(-337.5,-187.5) 89(-262.5,-187.5) 90(-187.5,-187.5) 91(-112.5,-187.5) 92(-37.5,-187.5) 93(37.5,-187.5) 94(112.5,-187.5) 95(187.5,-187.5) 96(262.5,-187.5) 97(412.5,-187.5) 98(-412.5,-262.5) 99(-337.5,-262.5) 100(-262.5,-262.5) 101(-187.5,-262.5) 102(-112.5,-262.5) 103(-37.5,-262.5) 104(37.5,-262.5) 105(112.5,-262.5) 106(187.5,-262.5) 107(262.5,-262.5) 108(337.5,-262.5) 109(412.5,-262.5) 110(-412.5,-337.5) 111(-337.5,-337.5) 112(-262.5,-337.5) 113(-187.5,-337.5) 114(-112.5,-337.5) 115(-37.5,-337.5) 116(37.5,-337.5) 117(112.5,-337.5) 118(187.5,-337.5) 119(262.5,-337.5) 120(337.5,-337.5) 121(412.5,-337.5) 122(-412.5,-412.5) 123(-337.5,-412.5) 124(-262.5,-412.5) 125(-187.5,-412.5) 126(-112.5,-412.5) 127(-37.5,-412.5) 128(37.5,-412.5) 129(112.5,-412.5) 130(187.5,-412.5) 131(262.5,-412.5) 132(337.5,-412.5) 133(412.5,-412.5)
  rrect100% 38.39x38.39 smd: 34(-412.5,187.5) 35(-337.5,187.5) 36(-262.5,187.5) 37(-187.5,187.5) 38(-112.5,187.5) 39(-37.5,187.5) 40(112.5,187.5) 41(187.5,187.5) 42(262.5,187.5) 43(337.5,187.5) 44(412.5,187.5) 45(-412.5,112.5) 46(-337.5,112.5) 47(-262.5,112.5) 48(-187.5,112.5) 49(-112.5,112.5) 50(-37.5,112.5) 51(37.5,112.5) 52(187.5,112.5) 53(412.5,112.5) 54(-412.5,37.5) 55(-337.5,37.5) 56(-262.5,37.5) 57(-187.5,37.5) 58(-112.5,37.5) 59(-37.5,37.5) 60(37.5,37.5) 61(112.5,37.5) 62(187.5,37.5) 63(337.5,37.5) 64(412.5,37.5) 65(-412.5,-37.5) 66(-337.5,-37.5) 67(-262.5,-37.5) 68(-187.5,-37.5) 69(-112.5,-37.5) 70(-37.5,-37.5) 71(37.5,-37.5) 72(112.5,-37.5) 73(187.5,-37.5) 74(337.5,-37.5) 75(412.5,-37.5) 76(-412.5,-112.5) 77(-337.5,-112.5) 78(-262.5,-112.5) 79(-187.5,-112.5) 80(-112.5,-112.5) 81(-37.5,-112.5)
Top Layer:
  region: 0,0 10,0 10,10 0,10
Top Paste:
  region: 0,0 10,0 10,10 0,10
Top Solder:
  region: 0,0 10,0 10,10 0,10
Mechanical 2:
  lines w11.81: -442.91,-442.91 -442.91,425.2 -425.2,442.91 442.91,442.91 442.91,-442.91 -442.91,-442.91

## LGA133(1884) [mil]
pads (133):
  rrect100% 37.2x37.2 smd: 1(-412.5,412.5) 34(187.5,187.5) 35(262.5,187.5) 36(337.5,187.5) 37(412.5,187.5) 38(-412.5,112.5) 39(-37.5,112.5) 40(37.5,112.5) 41(112.5,112.5) 42(187.5,112.5) 43(262.5,112.5) 44(337.5,112.5) 45(412.5,112.5) 46(-412.5,37.5) 47(-337.5,37.5) 48(-262.5,37.5) 49(-112.5,37.5) 50(-37.5,37.5) 51(37.5,37.5) 52(112.5,37.5) 53(187.5,37.5) 54(262.5,37.5) 55(337.5,37.5) 56(412.5,37.5) 57(-412.5,-37.5) 58(-337.5,-37.5) 59(-262.5,-37.5) 60(-187.5,-37.5) 61(-112.5,-37.5) 62(-37.5,-37.5) 63(37.5,-37.5) 64(112.5,-37.5) 65(187.5,-37.5) 66(262.5,-37.5) 67(337.5,-37.5) 68(412.5,-37.5) 69(-412.5,-112.5) 70(-337.5,-112.5) 71(-262.5,-112.5) 72(-187.5,-112.5) 73(-112.5,-112.5) 74(-37.5,-112.5) 75(37.5,-112.5) 76(112.5,-112.5) 77(187.5,-112.5) 78(262.5,-112.5) 79(337.5,-112.5) 80(412.5,-112.5) 81(-412.5,-187.5)
  rect 37.2x37.2 smd: 2(-337.5,412.5) 3(-262.5,412.5) 4(-187.5,412.5) 5(-112.5,412.5) 6(-37.5,412.5) 7(37.5,412.5) 8(112.5,412.5) 9(187.5,412.5) 10(262.5,412.5) 11(337.5,412.5) 12(412.5,412.5) 13(-412.5,337.5) 14(-337.5,337.5) 15(-262.5,337.5) 16(-187.5,337.5) 17(37.5,337.5) 18(112.5,337.5) 19(262.5,337.5) 20(337.5,337.5) 21(412.5,337.5) 22(-412.5,262.5) 23(-262.5,262.5) 24(187.5,262.5) 25(262.5,262.5) 26(337.5,262.5) 27(412.5,262.5) 28(-412.5,187.5) 29(-337.5,187.5) 30(-187.5,187.5) 31(-37.5,187.5) 32(37.5,187.5) 33(112.5,187.5) 82(-337.5,-187.5) 83(-262.5,-187.5) 84(-187.5,-187.5) 85(-112.5,-187.5) 86(-37.5,-187.5) 87(37.5,-187.5) 88(112.5,-187.5) 89(187.5,-187.5) 90(262.5,-187.5) 91(337.5,-187.5) 92(412.5,-187.5) 93(-412.5,-262.5) 94(-337.5,-262.5) 95(-262.5,-262.5) 96(-187.5,-262.5) 97(-112.5,-262.5) 98(-37.5,-262.5) 99(37.5,-262.5) 100(112.5,-262.5) 101(187.5,-262.5) 102(262.5,-262.5) 103(337.5,-262.5) 104(412.5,-262.5) 105(-412.5,-337.5) 106(-337.5,-337.5) 107(-262.5,-337.5) 108(-187.5,-337.5) 109(-112.5,-337.5) 110(-37.5,-337.5) 111(37.5,-337.5) 112(112.5,-337.5) 113(187.5,-337.5) 114(262.5,-337.5) 115(337.5,-337.5) 116(412.5,-337.5) 117(-412.5,-412.5) 118(-337.5,-412.5) 119(-262.5,-412.5) 120(-187.5,-412.5) 121(-112.5,-412.5) 122(-37.5,-412.5) 123(37.5,-412.5) 124(112.5,-412.5) 125(187.5,-412.5) 126(262.5,-412.5) 127(337.5,-412.5) 128(412.5,-412.5) 129(187.5,337.5) 130(112.5,262.5) 131(37.5,262.5) 132(-112.5,112.5) 133(-112.5,337.5)
Mechanical 2:
  drawing of 1072 lines, arcs and shapes, not listed

## LGA133-1755(V) [mil]
pads (133):
  rrect100% 11.05x11.05 smd: 1(-104.78,104.78) 34(66.68,66.68) 35(85.73,66.68) 36(104.78,66.68) 37(-104.78,47.63) 38(-85.73,47.63) 39(-66.68,47.63) 40(-47.63,47.63) 41(-28.58,47.63) 42(-9.53,47.63) 44(28.58,47.63) 45(47.63,47.63) 46(66.68,47.63) 47(85.73,47.63) 48(104.78,47.63) 49(-104.78,28.58) 50(-85.73,28.58) 51(-66.68,28.58) 52(-47.63,28.58) 53(-28.58,28.58) 54(-9.53,28.58) 55(9.53,28.58) 57(47.63,28.58) 60(104.78,28.58) 61(-104.78,9.53) 62(-85.73,9.53) 63(-66.68,9.53) 64(-47.63,9.53) 65(-28.58,9.53) 66(-9.53,9.53) 67(9.53,9.53) 68(28.58,9.53) 69(47.63,9.53) 71(85.73,9.53) 72(104.78,9.53) 73(-104.78,-9.53) 74(-85.73,-9.53) 75(-66.68,-9.53) 76(-47.63,-9.53) 77(-28.58,-9.53) 78(-9.53,-9.53) 79(9.53,-9.53) 80(28.58,-9.53) 81(47.63,-9.53)
  rect 11.05x11.05 smd: 2(-85.73,104.78) 3(-66.68,104.78) 4(-47.63,104.78) 5(-28.58,104.78) 6(-9.53,104.78) 7(9.53,104.78) 8(28.58,104.78) 9(47.63,104.78) 10(66.68,104.78) 11(85.73,104.78) 12(104.78,104.78) 13(-104.78,85.73) 14(-85.73,85.73) 15(-66.68,85.73) 16(-47.63,85.73) 17(-28.58,85.73) 18(-9.53,85.73) 19(9.53,85.73) 21(47.63,85.73) 23(85.73,85.73) 24(104.78,85.73) 25(-104.78,66.68) 26(-85.73,66.68) 27(-66.68,66.68) 28(-47.63,66.68) 29(-28.58,66.68) 30(-9.53,66.68) 31(9.53,66.68) 33(47.63,66.68) 83(85.73,-9.53) 84(104.78,-9.53) 85(-104.78,-28.58) 86(-85.73,-28.58) 87(-66.68,-28.58) 88(-47.63,-28.58) 89(-28.58,-28.58) 90(-9.53,-28.58) 91(9.53,-28.58) 92(28.58,-28.58) 93(47.63,-28.58) 95(85.73,-28.58) 96(104.78,-28.58) 97(-104.78,-47.63) 98(-85.73,-47.63) 99(-66.68,-47.63) 100(-47.63,-47.63) 101(-28.58,-47.63) 102(-9.53,-47.63) 103(9.53,-47.63) 104(28.58,-47.63) 105(47.63,-47.63) 106(66.68,-47.63) 108(104.78,-47.63) 109(-104.78,-66.68) 110(-85.73,-66.68) 111(-66.68,-66.68) 112(-47.63,-66.68) 113(-28.58,-66.68) 114(-9.53,-66.68) 115(9.53,-66.68) 116(28.58,-66.68) 117(47.63,-66.68) 118(66.68,-66.68) 119(85.73,-66.68) 120(104.78,-66.68) 121(-104.78,-85.73) 122(-85.73,-85.73) 123(-66.68,-85.73) 124(-47.63,-85.73) 125(-28.58,-85.73) 126(-9.53,-85.73) 127(9.53,-85.73) 128(28.58,-85.73) 129(47.63,-85.73) 130(66.68,-85.73) 131(85.73,-85.73) 132(104.78,-85.73) 133(-104.78,-104.78) 134(-85.73,-104.78) 135(-66.68,-104.78) 136(-47.63,-104.78) 137(-28.58,-104.78) 138(-9.53,-104.78) 139(9.53,-104.78) 140(28.58,-104.78) 141(47.63,-104.78) 142(66.68,-104.78) 143(85.73,-104.78) 144(104.78,-104.78)
Mechanical 2:
  lines w3.05: -113.03,-113.03 -113.03,108.15 -108.15,113.03 113.03,113.03 113.03,-113.03 -113.03,-113.03

## LGA133-1766(V) [mil]
pads (133):
  rrect100% 38.68x38.68 smd: A1(-412.5,412.5) D2(-337.5,187.5) D3(-262.5,187.5) D4(-187.5,187.5) D5(-112.5,187.5) D6(-37.5,187.5) D9(187.5,187.5) D11(337.5,187.5) D12(412.5,187.5) E1(-412.5,112.5) E2(-337.5,112.5) E3(-262.5,112.5) E4(-187.5,112.5) E5(-112.5,112.5) E6(-37.5,112.5) E7(37.5,112.5) E8(112.5,112.5) E11(337.5,112.5) E12(412.5,112.5) F1(-412.5,37.5) F2(-337.5,37.5) F3(-262.5,37.5) F4(-187.5,37.5) F5(-112.5,37.5) F6(-37.5,37.5) F7(37.5,37.5) F8(112.5,37.5) F9(187.5,37.5) F12(412.5,37.5) G1(-412.5,-37.5) G2(-337.5,-37.5) G3(-262.5,-37.5) G4(-187.5,-37.5) G5(-112.5,-37.5) G6(-37.5,-37.5) G7(37.5,-37.5) G8(112.5,-37.5) G9(187.5,-37.5) G10(262.5,-37.5) G11(337.5,-37.5) G12(412.5,-37.5) H1(-412.5,-112.5) H2(-337.5,-112.5) H3(-262.5,-112.5) H4(-187.5,-112.5) H5(-112.5,-112.5) H6(-37.5,-112.5) H7(37.5,-112.5) H8(112.5,-112.5)
  rect 38.68x38.68 smd: A2(-337.5,412.5) A3(-262.5,412.5) A4(-187.5,412.5) A5(-112.5,412.5) A6(-37.5,412.5) A7(37.5,412.5) A8(112.5,412.5) A9(187.5,412.5) A10(262.5,412.5) A11(337.5,412.5) A12(412.5,412.5) B1(-412.5,337.5) B2(-337.5,337.5) B3(-262.5,337.5) B4(-187.5,337.5) B5(-112.5,337.5) B6(-37.5,337.5) B7(37.5,337.5) B9(187.5,337.5) B11(337.5,337.5) B12(412.5,337.5) C1(-412.5,262.5) C2(-337.5,262.5) C3(-262.5,262.5) C4(-187.5,262.5) C5(-112.5,262.5) C6(-37.5,262.5) C7(37.5,262.5) C10(262.5,262.5) C11(337.5,262.5) C12(412.5,262.5) D1(-412.5,187.5) H9(187.5,-112.5) H10(262.5,-112.5) H11(337.5,-112.5) H12(412.5,-112.5) J1(-412.5,-187.5) J2(-337.5,-187.5) J3(-262.5,-187.5) J4(-187.5,-187.5) J5(-112.5,-187.5) J6(-37.5,-187.5) J7(37.5,-187.5) J8(112.5,-187.5) J9(187.5,-187.5) J10(262.5,-187.5) J11(337.5,-187.5) J12(412.5,-187.5) K1(-412.5,-262.5) K2(-337.5,-262.5) K3(-262.5,-262.5) K4(-187.5,-262.5) K5(-112.5,-262.5) K6(-37.5,-262.5) K7(37.5,-262.5) K8(112.5,-262.5) K9(187.5,-262.5) K10(262.5,-262.5) K11(337.5,-262.5) K12(412.5,-262.5) L1(-412.5,-337.5) L2(-337.5,-337.5) L3(-262.5,-337.5) L4(-187.5,-337.5) L5(-112.5,-337.5) L6(-37.5,-337.5) L7(37.5,-337.5) L8(112.5,-337.5) L9(187.5,-337.5) L10(262.5,-337.5) L11(337.5,-337.5) L12(412.5,-337.5) M1(-412.5,-412.5) M2(-337.5,-412.5) M3(-262.5,-412.5) M4(-187.5,-412.5) M5(-112.5,-412.5) M6(-37.5,-412.5) M7(37.5,-412.5) M8(112.5,-412.5) M9(187.5,-412.5) M10(262.5,-412.5) M11(337.5,-412.5) M12(412.5,-412.5)
Mechanical 2:
  lines w11.81: -445.87,380.91 -377.95,380.91 -377.95,442.91 ; -445.57,-445.57 -445.57,428.44 -430.81,443.21 443.21,443.21 443.21,-445.57 -445.57,-445.57